# Altium footprint library ICs And Semiconductors SMD.PcbLib: 602 footprints (part 23 of 38)
Each footprint in its own frame and in the unit in brackets; x right, y up, seen from the top. Pads: shape width x height; smd on the part's side, far side on the other; paste and mask are expansions set on the pad; w line width, h text height; cw(c..) or ccw(c..) is an arc to the next point about the centre after c.
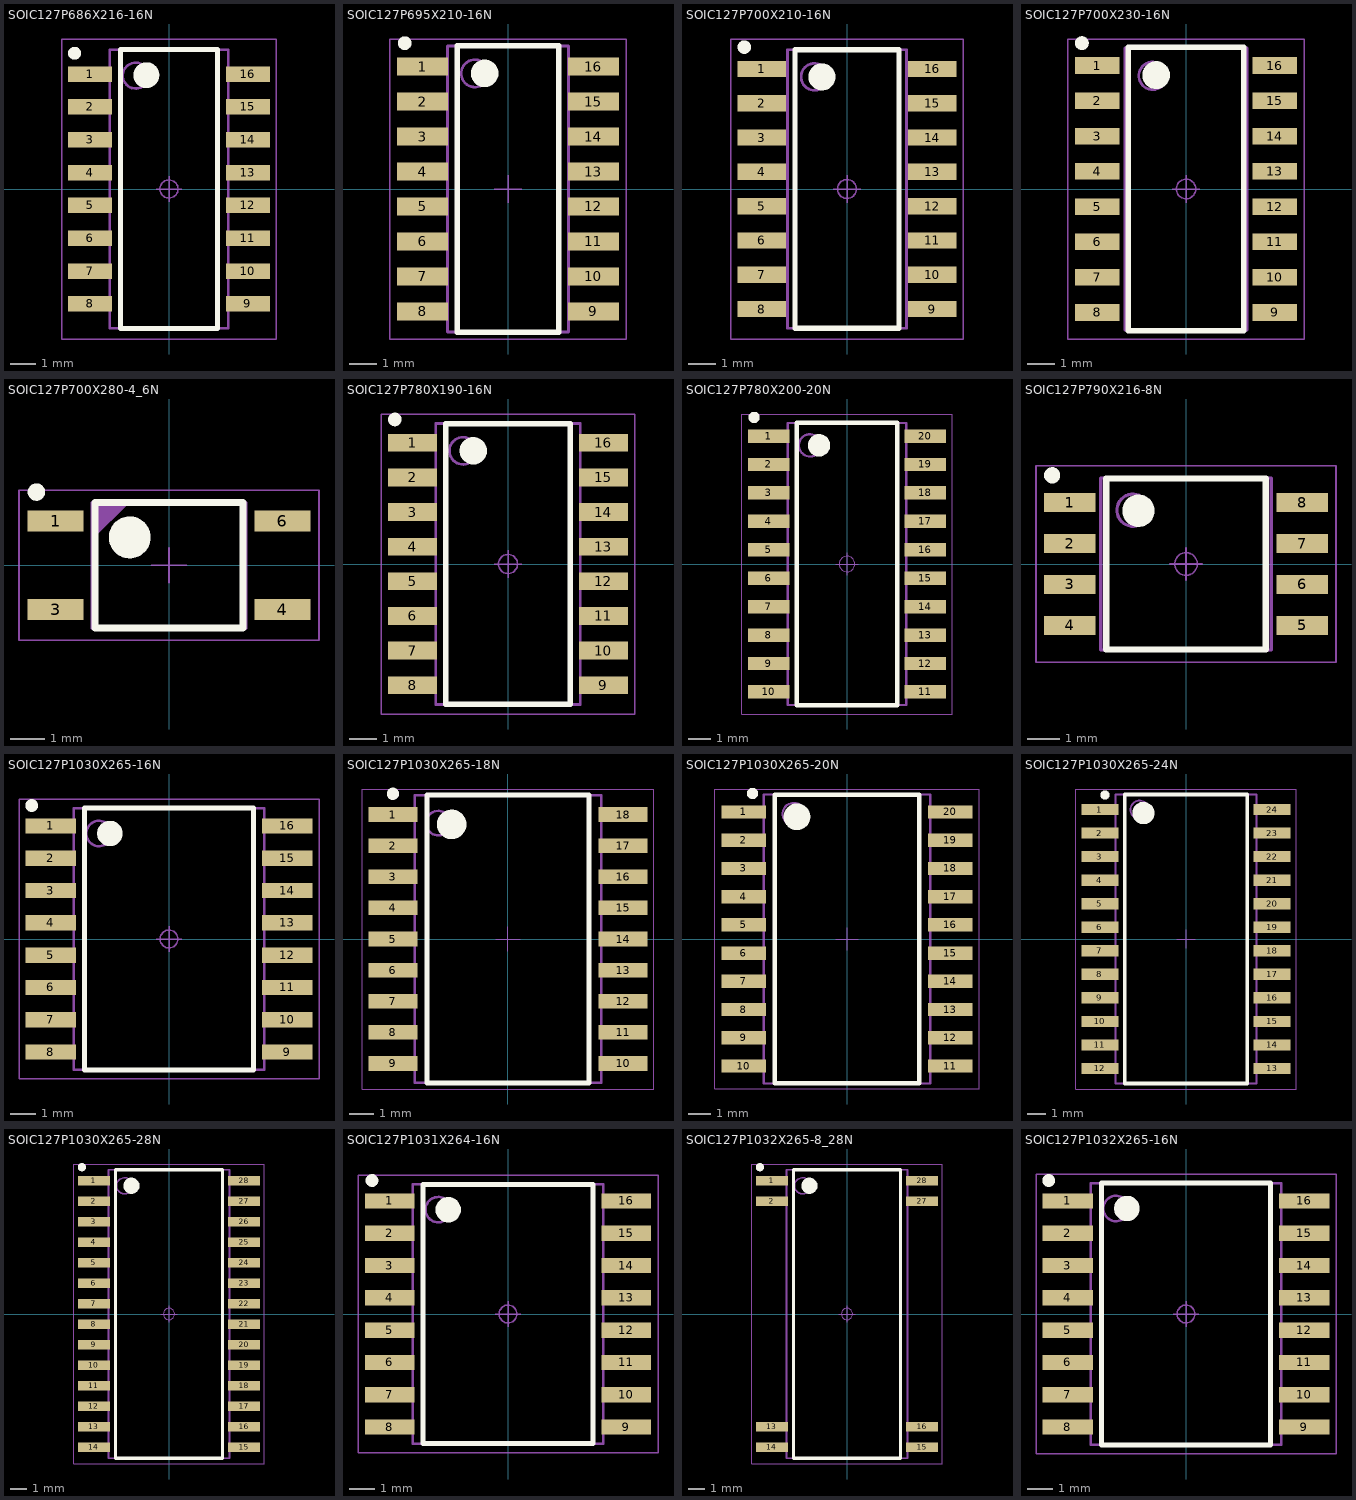
[diagram p22: the footprints below, top view; thin cyan lines are the x and y axes]

## SOIC127P686X216-16N [mm] "SOIC, 1.27mm Pitch; 16 Pin, 4.575mm W X 10.77mm L X 2.16mm H Body, IPC Medium Density"
height 2.16
pads (16):
  rect 1.7x0.6 smd: 1(-3.05,4.445) 2(-3.05,3.175) 3(-3.05,1.905) 4(-3.05,0.635) 5(-3.05,-0.635) 6(-3.05,-1.905) 7(-3.05,-3.175) 8(-3.05,-4.445) 9(3.05,-4.445) 10(3.05,-3.175) 11(3.05,-1.905) 12(3.05,-0.635) 13(3.05,0.635) 14(3.05,1.905) 15(3.05,3.175) 16(3.05,4.445)
Top Overlay:
  circle w0.5: c-0.875,4.4 r0.25
  circle w0.25: c-3.65,5.25 r0.125
  lines w0.2: -1.875,-5.4 1.875,-5.4 1.875,5.4 -1.875,5.4 -1.875,-5.4
Mechanical 14:
  circle w0.1: c-1.288,4.385 r0.5
  lines w0.1: -2.288,-5.385 2.288,-5.385 2.288,5.385 -2.288,5.385 -2.288,-5.385
Mechanical 15:
  circle w0.05: c0,0 r0.35
  lines w0.05: -0.5,0 0.5,0 ; 0,-0.5 0,0.5 ; -4.15,-5.8 4.15,-5.8 4.15,5.8 -4.15,5.8 -4.15,-5.8
3D body "SOIC127P686X216-16N.stp": height 2.16, standoff 0, extent -3.555,-5.51 3.555,5.51

## SOIC127P695X210-16N [mm] "SOIC, 16-Leads, Body 10.4x4.6mm (max), Pitch 1.27mm, IPC Medium Density"
height 2.1
pads (16):
  rect 1.85x0.65 smd: 1(-3.1,4.445) 2(-3.1,3.175) 3(-3.1,1.905) 4(-3.1,0.635) 5(-3.1,-0.635) 6(-3.1,-1.905) 7(-3.1,-3.175) 8(-3.1,-4.445) 9(3.1,-4.445) 10(3.1,-3.175) 11(3.1,-1.905) 12(3.1,-0.635) 13(3.1,0.635) 14(3.1,1.905) 15(3.1,3.175) 16(3.1,4.445)
Top Overlay:
  circle w0.5: c-0.85,4.2 r0.25
  circle w0.25: c-3.75,5.3 r0.125
  lines w0.2: -1.85,-5.2 1.85,-5.2 1.85,5.2 -1.85,5.2 -1.85,-5.2
Mechanical 14:
  circle w0.1: c-1.2,4.2 r0.5
  lines w0.1: -2.2,-5.2 2.2,-5.2 2.2,5.2 -2.2,5.2 -2.2,-5.2
Mechanical 15:
  lines w0.05: -0.5,0 0.5,0 ; 0,-0.5 0,0.5 ; -4.3,-5.45 4.3,-5.45 4.3,5.45 -4.3,5.45 -4.3,-5.45
3D body "SOIC127P695X210-16N.stp": height 2.1, standoff 0, extent -3.68,-5.2 3.681,5.2

## SOIC127P700X210-16N [mm] "SOIC, 1.27mm Pitch; 16 Pin, 4.40mm W X 10.30mm L X 2.10mm H Body, IPC Medium Density"
height 2.1
pads (16):
  rect 1.8x0.6 smd: 1(-3.15,4.445) 2(-3.15,3.175) 3(-3.15,1.905) 4(-3.15,0.635) 5(-3.15,-0.635) 6(-3.15,-1.905) 7(-3.15,-3.175) 8(-3.15,-4.445) 9(3.15,-4.445) 10(3.15,-3.175) 11(3.15,-1.905) 12(3.15,-0.635) 13(3.15,0.635) 14(3.15,1.905) 15(3.15,3.175) 16(3.15,4.445)
Top Overlay:
  circle w0.5: c-0.925,4.15 r0.25
  circle w0.25: c-3.8,5.25 r0.125
  lines w0.2: -1.925,-5.15 -1.925,5.15 1.925,5.15 1.925,-5.15 -1.925,-5.15
Mechanical 14:
  circle w0.1: c-1.2,4.15 r0.5
  lines w0.1: -2.2,-5.15 -2.2,5.15 2.2,5.15 2.2,-5.15 -2.2,-5.15
Mechanical 15:
  circle w0.05: c0,0 r0.35
  lines w0.05: -0.5,0 0.5,0 ; 0,-0.5 0,0.5 ; -4.3,-5.55 -4.3,5.55 4.3,5.55 4.3,-5.55 -4.3,-5.55
3D body "SOIC127P700X210-16N.stp": height 2.1, standoff 0, extent -3.53,-5.275 3.531,5.275

## SOIC127P700X230-16N [mm] "SOIC, 1.27mm Pitch; 16 Pin,4.40mm W X 10.15mm L X 2.30mm H Body, IPC Medium Density"
height 2.3
pads (16):
  rect 1.6x0.6 smd: 1(-3.2,4.445) 2(-3.2,3.175) 3(-3.2,1.905) 4(-3.2,0.635) 5(-3.2,-0.635) 6(-3.2,-1.905) 7(-3.2,-3.175) 8(-3.2,-4.445) 9(3.2,-4.445) 10(3.2,-3.175) 11(3.2,-1.905) 12(3.2,-0.635) 13(3.2,0.635) 14(3.2,1.905) 15(3.2,3.175) 16(3.2,4.445)
Top Overlay:
  circle w0.5: c-1.075,4.1 r0.25
  circle w0.25: c-3.75,5.25 r0.125
  lines w0.2: -2.075,-5.1 2.075,-5.1 2.075,5.1 -2.075,5.1 -2.075,-5.1
Mechanical 14:
  circle w0.1: c-1.2,4.075 r0.5
  lines w0.1: -2.2,-5.075 2.2,-5.075 2.2,5.075 -2.2,5.075 -2.2,-5.075
Mechanical 15:
  circle w0.05: c0,0 r0.35
  lines w0.05: -0.5,0 0.5,0 ; 0,-0.5 0,0.5 ; -4.25,-5.4 4.25,-5.4 4.25,5.4 -4.25,5.4 -4.25,-5.4
3D body "SOIC127P700X230-16N.stp": height 2.3, standoff 0, extent -3.53,-5.275 3.531,5.275

## SOIC127P700X280-4_6N [mm] "SOIC, 1.27mm, pitch; 4 pin, 4.40mm W X 3.60mm L X 2.80mm H body, IPC Medium Density"
height 2.8
pads (4):
  rect 1.6x0.6 smd: 1(-3.25,1.27) 3(-3.25,-1.27) 4(3.25,-1.27) 6(3.25,1.27)
Top Overlay:
  circle w0.25: c-3.8,2.1 r0.125
  circle w0.6: c-1.125,0.8 r0.3
  lines w0.2: -2.125,-1.8 2.125,-1.8 2.125,1.8 -2.125,1.8 -2.125,-1.8
Mechanical 14:
  lines w0.1: -2.2,0.8 -1.2,1.8 ; -2.2,0.9 -1.3,1.8 ; -2.2,1 -1.4,1.8 ; -2.2,1.1 -1.5,1.8 ; -2.2,1.2 -1.6,1.8 ; -2.2,1.3 -1.7,1.8 ; -2.2,1.4 -1.8,1.8 ; -2.2,1.5 -1.9,1.8 ; -2.2,1.6 -2,1.8 ; -2.2,1.7 -2.1,1.8 ; -2.2,-1.8 2.2,-1.8 2.2,1.8 -2.2,1.8 -2.2,-1.8
Mechanical 15:
  lines w0.05: -0.5,0 0.5,0 ; 0,-0.5 0,0.5 ; -4.3,-2.15 4.3,-2.15 4.3,2.15 -4.3,2.15 -4.3,-2.15
3D body "SOIC127P700X280-4_6N.stp": height 2.8, standoff 0, extent -3.7,-1.9 3.7,1.9

## SOIC127P780X190-16N [mm] "SOIC, 1.27mm Pitch; 16 Pin, 5.30mm W X 10.30mm L X 1.90mm H body, IPC Medium Density"
height 1.9
pads (16):
  rect 1.8x0.65 smd: 1(-3.5,4.445) 2(-3.5,3.175) 3(-3.5,1.905) 4(-3.5,0.635) 5(-3.5,-0.635) 6(-3.5,-1.905) 7(-3.5,-3.175) 8(-3.5,-4.445) 9(3.5,-4.445) 10(3.5,-3.175) 11(3.5,-1.905) 12(3.5,-0.635) 13(3.5,0.635) 14(3.5,1.905) 15(3.5,3.175) 16(3.5,4.445)
Top Overlay:
  circle w0.5: c-1.275,4.15 r0.25
  circle w0.25: c-4.15,5.3 r0.125
  lines w0.2: -2.275,-5.15 2.275,-5.15 2.275,5.15 -2.275,5.15 -2.275,-5.15
Mechanical 14:
  circle w0.1: c-1.65,4.15 r0.5
  lines w0.1: -2.65,-5.15 2.65,-5.15 2.65,5.15 -2.65,5.15 -2.65,-5.15
Mechanical 15:
  circle w0.05: c0,0 r0.35
  lines w0.05: -0.5,0 0.5,0 ; 0,-0.5 0,0.5 ; -4.65,-5.5 4.65,-5.5 4.65,5.5 -4.65,5.5 -4.65,-5.5
3D body "SOIC127P780X190-16N.stp": height 1.9, standoff 0, extent -3.913,-5.25 3.913,5.25

## SOIC127P780X200-20N [mm] "SOIC, 1.27mm Pitch; 20 Pin, 5.30mm W X 12.60mm L X 2.00mm H body, IPC Medium Density"
height 2
pads (20):
  rect 1.85x0.6 smd: 1(-3.5,5.715) 2(-3.5,4.445) 3(-3.5,3.175) 4(-3.5,1.905) 5(-3.5,0.635) 6(-3.5,-0.635) 7(-3.5,-1.905) 8(-3.5,-3.175) 9(-3.5,-4.445) 10(-3.5,-5.715) 11(3.5,-5.715) 12(3.5,-4.445) 13(3.5,-3.175) 14(3.5,-1.905) 15(3.5,-0.635) 16(3.5,0.635) 17(3.5,1.905) 18(3.5,3.175) 19(3.5,4.445) 20(3.5,5.715)
Top Overlay:
  circle w0.5: c-1.25,5.3 r0.25
  circle w0.25: c-4.15,6.55 r0.125
  lines w0.2: -2.25,-6.3 2.25,-6.3 2.25,6.3 -2.25,6.3 -2.25,-6.3
Mechanical 14:
  circle w0.1: c-1.65,5.3 r0.5
  lines w0.1: -2.65,-6.3 2.65,-6.3 2.65,6.3 -2.65,6.3 -2.65,-6.3
Mechanical 15:
  circle w0.05: c0,0 r0.35
  lines w0.05: -0.5,0 0.5,0 ; 0,-0.5 0,0.5 ; -4.7,-6.7 4.7,-6.7 4.7,6.7 -4.7,6.7 -4.7,-6.7
3D body "SOIC127P780X200-20N.stp": height 2, standoff 0, extent -3.9,-6.3 3.9,6.3

## SOIC127P790X216-8N [mm] "SOIC, 1.27mm, Pitch; 8 Pin, 5.285mm W X 5.335mm L X 2.16mm H body, IPC Medium Density"
height 2.16
pads (8):
  rect 1.6x0.6 smd: 1(-3.6,1.905) 2(-3.6,0.635) 3(-3.6,-0.635) 4(-3.6,-1.905) 5(3.6,-1.905) 6(3.6,-0.635) 7(3.6,0.635) 8(3.6,1.905)
Top Overlay:
  circle w0.5: c-1.475,1.65 r0.25
  circle w0.25: c-4.15,2.75 r0.125
  lines w0.2: -2.475,-2.65 2.475,-2.65 2.475,2.65 -2.475,2.65 -2.475,-2.65
Mechanical 14:
  circle w0.1: c-1.642,1.668 r0.5
  lines w0.1: -2.642,-2.668 2.642,-2.668 2.642,2.668 -2.642,2.668 -2.642,-2.668
Mechanical 15:
  circle w0.05: c0,0 r0.35
  lines w0.05: -0.5,0 0.5,0 ; 0,-0.5 0,0.5 ; -4.65,-3.05 4.65,-3.05 4.65,3.05 -4.65,3.05 -4.65,-3.05
3D body "SOIC127P790X216-8N.stp": height 2, standoff 0, extent -3.863,-2.54 3.863,2.54

## SOIC127P1030X265-16N [mm] "SOIC 16, Pitch 1.27mm - Body 7.5x10.3mm, IPC Medium Density"
height 2.65
pads (16):
  rect 2x0.6 smd: 1(-4.65,4.445) 2(-4.65,3.175) 3(-4.65,1.905) 4(-4.65,0.635) 5(-4.65,-0.635) 6(-4.65,-1.905) 7(-4.65,-3.175) 8(-4.65,-4.445) 9(4.65,-4.445) 10(4.65,-3.175) 11(4.65,-1.905) 12(4.65,-0.635) 13(4.65,0.635) 14(4.65,1.905) 15(4.65,3.175) 16(4.65,4.445)
Top Overlay:
  circle w0.5: c-2.325,4.15 r0.25
  circle w0.25: c-5.4,5.25 r0.125
  lines w0.2: -3.325,-5.15 3.325,-5.15 3.325,5.15 -3.325,5.15 -3.325,-5.15
Mechanical 14:
  circle w0.1: c-2.75,4.15 r0.5
  lines w0.1: -3.75,-5.15 3.75,-5.15 3.75,5.15 -3.75,5.15 -3.75,-5.15
Mechanical 15:
  circle w0.05: c0,0 r0.35
  lines w0.05: -0.5,0 0.5,0 ; 0,-0.5 0,0.5 ; -5.9,-5.5 5.9,-5.5 5.9,5.5 -5.9,5.5 -5.9,-5.5
3D body "SOIC127P1030X265-16N.stp": height 1.68, standoff 0, extent -5.18,-5.25 5.18,5.25

## SOIC127P1030X265-18N [mm] "SOIC, 18-Leads, Body 13.9x7.6mm (max), Pitch 1.27mm, IPC Medium Density"
height 2.65
pads (18):
  rect 2x0.6 smd: 1(-4.7,5.08) 2(-4.7,3.81) 3(-4.7,2.54) 4(-4.7,1.27) 5(-4.7,0) 6(-4.7,-1.27) 7(-4.7,-2.54) 8(-4.7,-3.81) 9(-4.7,-5.08) 10(4.7,-5.08) 11(4.7,-3.81) 12(4.7,-2.54) 13(4.7,-1.27) 14(4.7,0) 15(4.7,1.27) 16(4.7,2.54) 17(4.7,3.81) 18(4.7,5.08)
Top Overlay:
  circle w0.6: c-2.3,4.68 r0.3
  circle w0.25: c-4.7,5.93 r0.125
  lines w0.2: -3.3,-5.875 3.3,-5.875 3.3,5.875 -3.3,5.875 -3.3,-5.875
Mechanical 14:
  circle w0.1: c-2.85,4.73 r0.5
  lines w0.1: -3.8,-5.875 3.8,-5.875 3.8,5.875 -3.8,5.875 -3.8,-5.875
Mechanical 15:
  lines w0.05: -0.5,0 0.5,0 ; 0,-0.5 0,0.5 ; -5.95,-6.125 5.95,-6.125 5.95,6.125 -5.95,6.125 -5.95,-6.125
3D body "SOIC127P1030X265-18N.stp": height 1.68, standoff 0, extent -5.18,-5.875 5.18,5.875

## SOIC127P1030X265-20N [mm] "SOIC 20, Pitch 1.27mm - Body 7.5x12.8mm, IPC Medium Density"
height 2.65
pads (20):
  rect 2x0.6 smd: 1(-4.65,5.715) 2(-4.65,4.445) 3(-4.65,3.175) 4(-4.65,1.905) 5(-4.65,0.635) 6(-4.65,-0.635) 7(-4.65,-1.905) 8(-4.65,-3.175) 9(-4.65,-4.445) 10(-4.65,-5.715) 11(4.65,-5.715) 12(4.65,-4.445) 13(4.65,-3.175) 14(4.65,-1.905) 15(4.65,-0.635) 16(4.65,0.635) 17(4.65,1.905) 18(4.65,3.175) 19(4.65,4.445) 20(4.65,5.715)
Top Overlay:
  circle w0.25: c-4.25,6.55 r0.125
  circle w0.6: c-2.25,5.5 r0.3
  lines w0.2: -3.25,-6.5 -3.25,6.5 3.25,6.5 3.25,-6.5 -3.25,-6.5
Mechanical 14:
  circle w0.1: c-2.4,5.625 r0.5
  lines w0.1: -3.75,-6.5 3.75,-6.5 3.75,6.5 -3.75,6.5 -3.75,-6.5
Mechanical 15:
  lines w0.05: -0.5,0 0.5,0 ; 0,-0.5 0,0.5 ; -5.95,-6.75 -5.95,6.75 5.95,6.75 5.95,-6.75 -5.95,-6.75
3D body "SOIC127P1030X265-20N.stp": height 1.68, standoff 0, extent -5.18,-6.5 5.18,6.5

## SOIC127P1030X265-24N [mm] "SOIC 24, Pitch 1.27mm - Body 7.6x15.6mm, IPC Medium Density"
height 2.65
pads (24):
  rect 2x0.6 smd: 1(-4.65,6.985) 2(-4.65,5.715) 3(-4.65,4.445) 4(-4.65,3.175) 5(-4.65,1.905) 6(-4.65,0.635) 7(-4.65,-0.635) 8(-4.65,-1.905) 9(-4.65,-3.175) 10(-4.65,-4.445) 11(-4.65,-5.715) 12(-4.65,-6.985) 13(4.65,-6.985) 14(4.65,-5.715) 15(4.65,-4.445) 16(4.65,-3.175) 17(4.65,-1.905) 18(4.65,-0.635) 19(4.65,0.635) 20(4.65,1.905) 21(4.65,3.175) 22(4.65,4.445) 23(4.65,5.715) 24(4.65,6.985)
Top Overlay:
  circle w0.6: c-2.3,6.8 r0.3
  circle w0.25: c-4.375,7.775 r0.125
  lines w0.2: -3.3,-7.8 -3.3,7.8 3.3,7.8 3.3,-7.8 -3.3,-7.8
Mechanical 14:
  circle w0.1: c-2.5,6.975 r0.5
  lines w0.1: -3.8,-7.8 3.8,-7.8 3.8,7.8 -3.8,7.8 -3.8,-7.8
Mechanical 15:
  lines w0.05: -0.5,0 0.5,0 ; 0,-0.5 0,0.5 ; -5.95,-8.1 -5.95,8.1 5.95,8.1 5.95,-8.1 -5.95,-8.1
3D body "SOIC127P1030X265-24N.stp": height 1.68, standoff 0, extent -5.18,-7.8 5.18,7.8

## SOIC127P1030X265-28N [mm] "SOIC,1.27mm, Pitch;28 Pin, 7.50mm W X 17.90mm L X 2.65mm H body, IPC Medium Density"
height 2.65
pads (28):
  rect 2x0.6 smd: 1(-4.65,8.255) 2(-4.65,6.985) 3(-4.65,5.715) 4(-4.65,4.445) 5(-4.65,3.175) 6(-4.65,1.905) 7(-4.65,0.635) 8(-4.65,-0.635) 9(-4.65,-1.905) 10(-4.65,-3.175) 11(-4.65,-4.445) 12(-4.65,-5.715) 13(-4.65,-6.985) 14(-4.65,-8.255) 15(4.65,-8.255) 16(4.65,-6.985) 17(4.65,-5.715) 18(4.65,-4.445) 19(4.65,-3.175) 20(4.65,-1.905) 21(4.65,-0.635) 22(4.65,0.635) 23(4.65,1.905) 24(4.65,3.175) 25(4.65,4.445) 26(4.65,5.715) 27(4.65,6.985) 28(4.65,8.255)
Top Overlay:
  circle w0.25: c-5.4,9.1 r0.125
  circle w0.5: c-2.325,7.95 r0.25
  lines w0.2: -3.325,-8.95 -3.325,8.95 3.325,8.95 3.325,-8.95 -3.325,-8.95
Mechanical 14:
  circle w0.1: c-2.75,7.95 r0.5
  lines w0.1: -3.75,-8.95 -3.75,8.95 3.75,8.95 3.75,-8.95 -3.75,-8.95
Mechanical 15:
  circle w0.05: c0,0 r0.35
  lines w0.05: -0.5,0 0.5,0 ; 0,-0.5 0,0.5 ; -5.9,-9.3 -5.9,9.3 5.9,9.3 5.9,-9.3 -5.9,-9.3
3D body "SOIC127P1030X265-28N.stp": height 2.65, standoff 0, extent -5.185,-8.95 5.185,8.95

## SOIC127P1031X264-16N [mm] "SOIC, 1.27mm Pitch;16 Pin, 7.49mm W X 10.21mm L X 2.64mm H body, IPC Medium Density"
height 2.64
pads (16):
  rect 1.95x0.6 smd: 1(-4.65,4.445) 2(-4.65,3.175) 3(-4.65,1.905) 4(-4.65,0.635) 5(-4.65,-0.635) 6(-4.65,-1.905) 7(-4.65,-3.175) 8(-4.65,-4.445) 9(4.65,-4.445) 10(4.65,-3.175) 11(4.65,-1.905) 12(4.65,-0.635) 13(4.65,0.635) 14(4.65,1.905) 15(4.65,3.175) 16(4.65,4.445)
Top Overlay:
  circle w0.5: c-2.35,4.1 r0.25
  circle w0.25: c-5.35,5.25 r0.125
  lines w0.2: -3.35,-5.1 3.35,-5.1 3.35,5.1 -3.35,5.1 -3.35,-5.1
Mechanical 14:
  circle w0.1: c-2.745,4.105 r0.5
  lines w0.1: -3.745,-5.105 3.745,-5.105 3.745,5.105 -3.745,5.105 -3.745,-5.105
Mechanical 15:
  circle w0.05: c0,0 r0.35
  lines w0.05: -0.5,0 0.5,0 ; 0,-0.5 0,0.5 ; -5.9,-5.45 5.9,-5.45 5.9,5.45 -5.9,5.45 -5.9,-5.45
3D body "SOIC127P1031X264-16N.stp": height 2.65, standoff 0, extent -5.215,-5.151 5.215,5.151

## SOIC127P1032X265-8_28N [mm] "SOIC, Pitch 1.27mm; 8 Pin of 28, 7.50mm W X 17.90mm L X 2.65mm H body, IPC Medium Density"
height 2.65
pads (8):
  rect 2x0.6 smd: 1(-4.65,8.255) 2(-4.65,6.985) 13(-4.65,-6.985) 14(-4.65,-8.255) 15(4.65,-8.255) 16(4.65,-6.985) 27(4.65,6.985) 28(4.65,8.255)
Top Overlay:
  circle w0.5: c-2.325,7.95 r0.25
  circle w0.25: c-5.4,9.1 r0.125
  lines w0.2: -3.325,-8.95 3.325,-8.95 3.325,8.95 -3.325,8.95 -3.325,-8.95
Mechanical 14:
  circle w0.1: c-2.75,7.95 r0.5
  lines w0.1: -3.75,-8.95 3.75,-8.95 3.75,8.95 -3.75,8.95 -3.75,-8.95
Mechanical 15:
  circle w0.05: c0,0 r0.35
  lines w0.05: -0.5,0 0.5,0 ; 0,-0.5 0,0.5 ; -5.9,-9.3 5.9,-9.3 5.9,9.3 -5.9,9.3 -5.9,-9.3
3D body "SOIC127P1032X265-28_8N.stp": height 1.68, standoff 0, extent -5.18,-9.05 5.18,9.05

## SOIC127P1032X265-16N [mm] "SOIC, 1.27mm pitch; 16 pin, 7.50mm W X 10.4mm L X 2.65mm H body, IPC Medium Density"
height 2.65
pads (16):
  rect 2x0.6 smd: 1(-4.65,4.445) 2(-4.65,3.175) 3(-4.65,1.905) 4(-4.65,0.635) 5(-4.65,-0.635) 6(-4.65,-1.905) 7(-4.65,-3.175) 8(-4.65,-4.445) 9(4.65,-4.445) 10(4.65,-3.175) 11(4.65,-1.905) 12(4.65,-0.635) 13(4.65,0.635) 14(4.65,1.905) 15(4.65,3.175) 16(4.65,4.445)
Top Overlay:
  circle w0.25: c-5.4,5.25 r0.125
  circle w0.5: c-2.325,4.15 r0.25
  lines w0.2: -3.325,-5.15 -3.325,5.15 3.325,5.15 3.325,-5.15 -3.325,-5.15
Mechanical 14:
  circle w0.1: c-2.75,4.15 r0.5
  lines w0.1: -3.75,-5.15 -3.75,5.15 3.75,5.15 3.75,-5.15 -3.75,-5.15
Mechanical 15:
  circle w0.05: c0,0 r0.35
  lines w0.05: -0.5,0 0.5,0 ; 0,-0.5 0,0.5 ; -5.9,-5.5 -5.9,5.5 5.9,5.5 5.9,-5.5 -5.9,-5.5
3D body "SOIC127P1032X265-16N.stp": height 1.68, standoff 0, extent -5.18,-5.25 5.18,5.25